# Altium footprint library Sigma_Library.PcbLib: 125 footprints (part 8 of 8)
Each footprint in its own frame and in the unit in brackets; x right, y up, seen from the top. Pads: shape width x height; smd on the part's side, far side on the other; paste and mask are expansions set on the pad; w line width, h text height; cw(c..) or ccw(c..) is an arc to the next point about the centre after c.
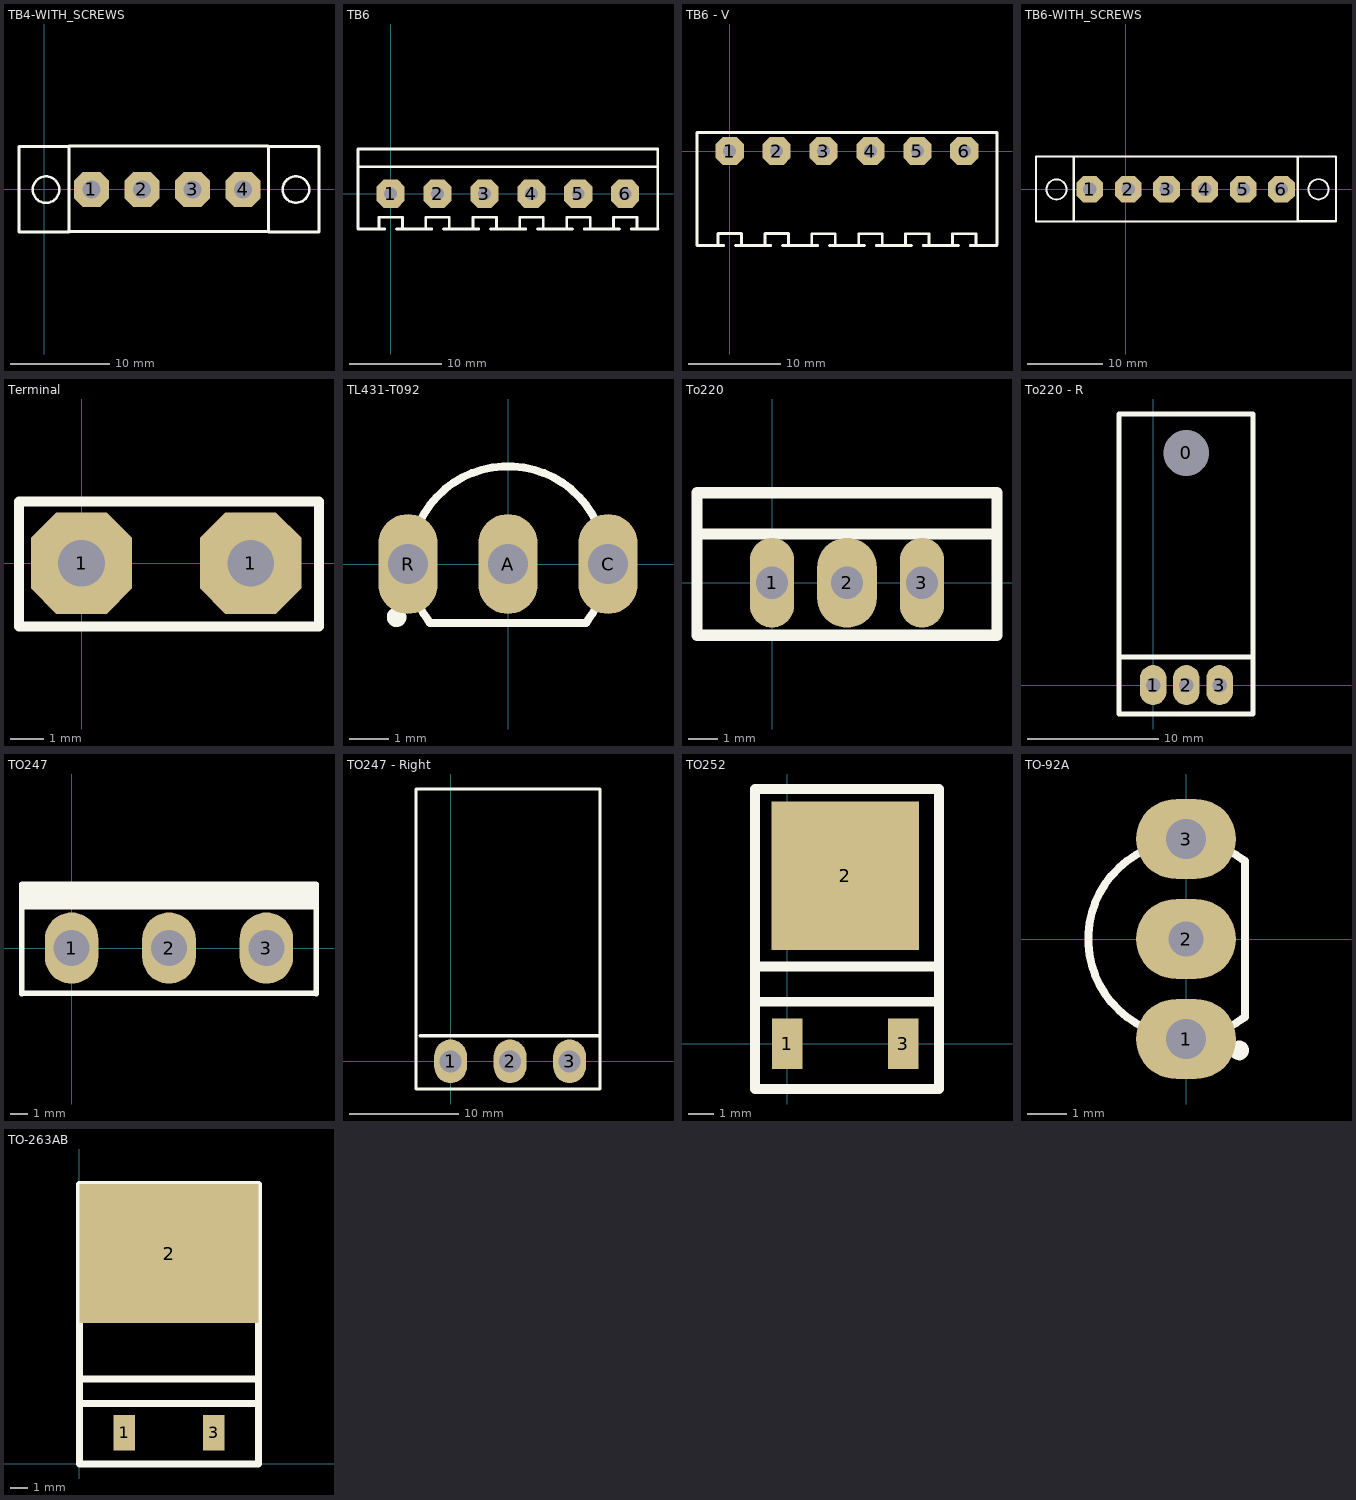
[diagram p7: the footprints below, top view; thin cyan lines are the x and y axes]

## TB4-WITH_SCREWS [mm] "TB3-with_screws"
pads (4):
  oct 3.54x3.54 hole 1.8: 1(4.74,0) 2(9.82,0) 3(14.9,0) 4(19.98,0)
Top Overlay:
  circle w0.254: c0.175,-0.02 r1.331
  circle w0.254: c25.295,-0.01 r1.331
  lines w0.305: -2.54,-4.27 -2.54,4.34 2.48,4.34 ; -2.53,-4.26 2.49,-4.26 ; 2.5,-4.25 22.5,-4.25 ; 2.5,-4.24 2.5,4.36 22.5,4.36 ; 22.52,-4.26 27.615,-4.26 27.615,4.34 22.56,4.34 22.56,-4.22

## TB6 [mil] "Terminal Block Straight"
pads (6):
  oct 120x120 hole 55.12: 1(0,0) 2(200,0) 3(400,0) 4(600,0) 5(800,0) 6(1000,0)
Top Overlay:
  lines w12: -139.37,115 1139.37,115 ; -50,-150 -50,-100 50,-100 50,-150 ; -25,-150 -139.37,-150 -139.37,75 -139.37,190.75 1139.37,190.75 1139.37,75 1139.37,-150 ; 25,-150 175,-150 ; 150,-150 150,-100 250,-100 250,-150 ; 226,-150 376,-150 ; 351,-150 351,-100 451,-100 451,-150 ; 426,-150 576,-150 ; 551,-150 551,-100 651,-100 651,-150 ; 626,-150 776,-150 ; 751,-150 751,-100 851,-100 851,-150 ; 826,-150 976,-150 ; 951,-150 951,-100 1051,-100 1051,-150 ; 1026,-150 1140.35,-150

## TB6 - V [mil] "Terminal Block Vertical"
pads (6):
  oct 120x120 hole 55.12: 1(0,0) 2(200,0) 3(400,0) 4(600,0) 5(800,0) 6(1000,0)
Top Overlay:
  lines w12: -139.37,75 -139.37,-401.97 -25,-401.97 ; -139.37,78.74 1139.37,78.74 ; -50,-401.97 -50,-351.97 50,-351.97 50,-401.97 ; 25,-401.97 175,-401.97 ; 150,-401.97 150,-351.97 250,-351.97 250,-401.97 ; 225,-402 375,-402 ; 225,-401.97 339.37,-401.97 ; 350,-402 350,-352 450,-352 450,-402 ; 425,-402 575,-402 ; 550,-402 550,-352 650,-352 650,-402 ; 625,-402 775,-402 ; 750,-402 750,-352 850,-352 850,-402 ; 825,-402 975,-402 ; 950,-402 950,-352 1050,-352 1050,-402 ; 1025,-402 1138,-402 ; 1139.37,-400.63 1139.37,75
3D body "15EDGRC-5.08- 06P-14-00A(H).stp": height 283.46, standoff -133.86, extent -100,-314.96 1100,47.24

## TB6-WITH_SCREWS [mm] "TB3-with_screws"
pads (6):
  oct 3.54x3.54 hole 1.8: 1(-4.785,0) 2(0.295,0) 3(5.375,0) 4(10.455,0) 5(15.535,0) 6(20.615,0)
Top Overlay:
  circle w0.254: c-9.209,-0.01 r1.331
  circle w0.254: c25.531,0.01 r1.331
  lines w0.305: -11.924,-4.26 -11.924,4.35 -6.904,4.35 ; -11.914,-4.25 -6.894,-4.25 ; -7.174,-4.25 22.826,-4.25 ; -7.174,4.36 22.826,4.36 ; -6.914,-4.24 -6.914,4.36 ; 22.756,-4.24 27.851,-4.24 27.851,4.36 22.796,4.36 22.796,-4.2

## Terminal [mil] "Battery Terminal male"
pads (2):
  oct 120x120 hole 55.12: 1(0,0) 1(200,0)
Top Overlay:
  lines w12: -74,-75 281,-75 281,73 -74,73 -74,-75
3D body "TE_1742361-1.stp": height 377.95, standoff -131.89, extent -38.55,-58.63 242.55,62.63

## TL431-T092 [mil]
height 210.24
pads (3):
  oval 59.06x100 hole 40: A(0,0) C(100,0) R(-100,0)
Top Overlay:
  circle w9.84: c-111.42,-53.15 r4.92
  lines w7.87: -77.95,-59.06 cw(c0,0) 77.95,-59.06 -77.95,-59.05
Mechanical 13:
  lines w3.94: -77.95,-59.06 cw(c0,0) 77.95,-59.06 -77.95,-59.05
3D body: height 270.08, standoff 0, extent -98.24,-59.08 98.24,97.82

## To220 [mm]
pads (3):
  oval 1.5x3.048 hole 1.1: 1(0,0) 3(5.08,0)
  oval 2.032x3.048 hole 1.1: 2(2.54,0)
Top Overlay:
  lines w0.381: -2.54,1.651 7.62,1.651 ; -2.54,-1.778 -2.54,3.048 7.62,3.048 7.62,-1.778 -2.54,-1.778
Top Paste:
  lines w0.5: -1.016,-0.483 -1.016,0.533 -0.737,0.813 -0.737,-0.762 -1.016,-0.483 ; 5.817,-0.813 5.817,0.762 6.096,0.483 6.096,-0.533 5.817,-0.813
Bottom Paste:
  lines w0.5: -1.016,-0.483 -1.016,0.533 -0.737,0.813 -0.737,-0.762 -1.016,-0.483 ; 5.817,-0.813 5.817,0.762 6.096,0.483 6.096,-0.533 5.817,-0.813
Top Solder:
  lines w0.5: -1.016,-0.483 -1.016,0.533 -0.737,0.813 -0.737,-0.762 -1.016,-0.483 ; 5.817,-0.813 5.817,0.762 6.096,0.483 6.096,-0.533 5.817,-0.813
3D body "TO-220AB-FairA.stp": height 16.96, standoff -11.74, extent -2.785,-1.7 7.865,3.1

## To220 - R [mil]
pads (4):
  round 78.74 hole 137.8 unplated: 0(100,698)
  oval 80x120 hole 43.31: 1(0,0) 2(100,0) 3(200,0)
Top Overlay:
  lines w15: -100,84 300,84 ; -103,-87 -103,815 301,815 301,-87 -103,-87
3D body "TO-220AB-HB-FairA.stp": height 307.09, standoff -90.57, extent -110.64,-113.8 308.65,816.12

## TO247 [mm]
pads (3):
  oval 3x4 hole 2.032: 1(0,0) 2(5.461,0) 3(10.922,0)
Top Overlay:
  region: -2.947,-2.54 -2.947,3.556 -2.947,3.586 -2.924,3.643 -2.881,3.686 -2.824,3.709 -2.794,3.709 13.716,3.709 13.746,3.709 13.803,3.686 13.846,3.643 13.869,3.586 13.869,3.556 13.869,-2.54 13.869,-2.603 13.779,-2.693 13.653,-2.693 13.563,-2.603 13.563,-2.54 13.563,2.176 -2.641,2.176 -2.641,-2.54 -2.641,-2.603 -2.731,-2.693 -2.857,-2.693 -2.947,-2.603
  lines w0.305: -2.794,2.328 13.716,2.328 ; -2.794,2.371 13.716,2.371 ; -2.794,-2.54 -2.794,3.556 13.716,3.556 13.716,-2.54 -2.794,-2.54
3D body "TO-247AC.stp": height 24.95, standoff -9.95, extent -2.464,-2.375 13.386,2.925

## TO247 - Right [mm]
pads (3):
  oval 3x4 hole 2.032: 1(0,0) 2(5.461,0) 3(10.922,0)
Top Overlay:
  lines w0.305: -2.794,2.328 13.716,2.328 ; -2.794,2.371 13.716,2.371 ; -3.175,-2.54 13.716,-2.54 13.716,24.994 -3.175,24.994 -3.175,-2.54
3D body "TO-247AC-HF.stp": height 5.3, standoff -4.85, extent -2.311,-0.857 13.539,27.928

## TO252 [mm] "For LM7805 SMD"
pads (3):
  rect 1.2x2 smd: 1(0,0) 3(4.57,0)
  rect 5.8x5.85 smd: 2(2.285,6.625)
Top Overlay:
  lines w0.381: -1.27,1.651 5.842,1.651 ; -1.27,3.048 5.969,3.048 ; -1.27,-1.778 -1.27,10.033 5.969,10.033 5.969,-1.778 -1.27,-1.778
3D body "TO-252AA-IRF.stp": height 2.39, standoff 0, extent -1.121,-0.711 5.591,9.703

## TO-92A [mil] "TO, Flat Index; 3 In-Line, Axial Leads; Body Dia. 4.5mm; Leads 0.51 x 0.48 mm (max)"
height 270.08
pads (3):
  oval 100x80 hole 40: 1(0,-100) 3(0,100)
  oval 100x80 hole 35.43: 2(0,0)
Top Overlay:
  circle w9.84: c53.15,-111.42 r4.92
  lines w7.87: 59.06,-77.95 cw(c0,0) 59.06,77.95 59.05,-77.95
Mechanical 13:
  lines w3.94: 59.06,-77.95 cw(c0,0) 59.06,77.95 59.05,-77.95
Mechanical 15:
  lines w3.94: -19.68,0 19.68,0 ; 0,-19.68 0,19.69
3D body: height 270.08, standoff 0, extent -97.82,-98.24 59.08,98.24

## TO-263AB [mil]
pads (3):
  rect 47.24x78.74 smd: 1(100,70) 3(300,70)
  rect 400x310 smd: 2(200,470)
Top Overlay:
  lines w15: 0,135 400,135 ; 0,190 400,190 ; 0,0 400,0 400,625 0,625 0,0
3D body "TO263-3-2.stp": height 165.95, standoff 0, extent 7.66,50 394.34,624.87